# Altium footprint library SpaceVNXBaseBoard.PcbLib: 47 footprints (part 2 of 3)
Each footprint in its own frame and in the unit in brackets; x right, y up, seen from the top. Pads: shape width x height; smd on the part's side, far side on the other; paste and mask are expansions set on the pad; w line width, h text height; cw(c..) or ccw(c..) is an arc to the next point about the centre after c.
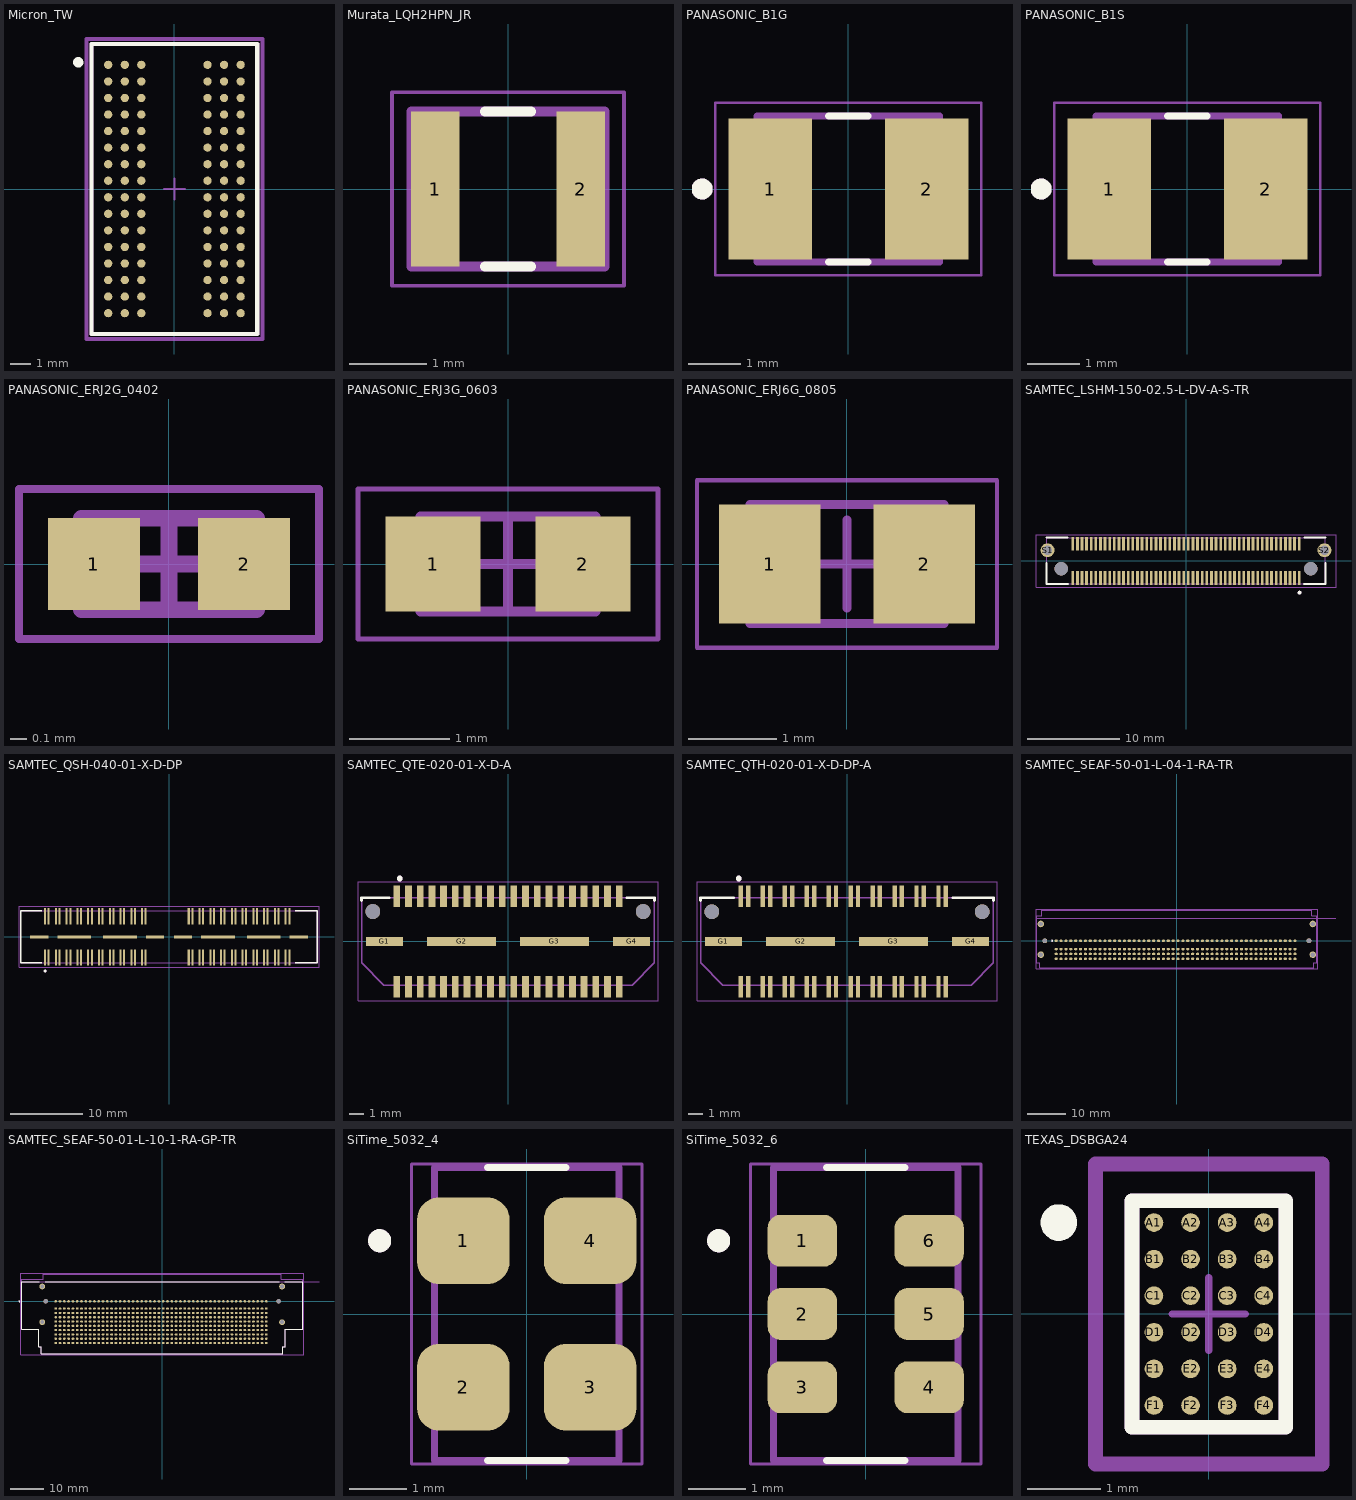
[diagram p1: the footprints below, top view; thin cyan lines are the x and y axes]

## Micron_TW [mm] "96-Ball FBGA 8mm x 14 mm"
pads (96):
  round 0.399 smd paste+0 mask+0: A1(-3.2,6) A2(-2.4,6) A3(-1.6,6) A7(1.6,6) A8(2.4,6) A9(3.2,6) B1(-3.2,5.2) B2(-2.4,5.2) B3(-1.6,5.2) B7(1.6,5.2) B8(2.4,5.2) B9(3.2,5.2) C1(-3.2,4.4) C2(-2.4,4.4) C3(-1.6,4.4) C7(1.6,4.4) C8(2.4,4.4) C9(3.2,4.4) D1(-3.2,3.6) D2(-2.4,3.6) D3(-1.6,3.6) D7(1.6,3.6) D8(2.4,3.6) D9(3.2,3.6) E1(-3.2,2.8) E2(-2.4,2.8) E3(-1.6,2.8) E7(1.6,2.8) E8(2.4,2.8) E9(3.2,2.8) F1(-3.2,2) F2(-2.4,2) F3(-1.6,2) F7(1.6,2) F8(2.4,2) F9(3.2,2) G1(-3.2,1.2) G2(-2.4,1.2) G3(-1.6,1.2) G7(1.6,1.2) G8(2.4,1.2) G9(3.2,1.2) H1(-3.2,0.4) H2(-2.4,0.4) H3(-1.6,0.4) H7(1.6,0.4) H8(2.4,0.4) H9(3.2,0.4) J1(-3.2,-0.4) J2(-2.4,-0.4) J3(-1.6,-0.4) J7(1.6,-0.4) J8(2.4,-0.4) J9(3.2,-0.4) K1(-3.2,-1.2) K2(-2.4,-1.2) K3(-1.6,-1.2) K7(1.6,-1.2) K8(2.4,-1.2) K9(3.2,-1.2) L1(-3.2,-2) L2(-2.4,-2) L3(-1.6,-2) L7(1.6,-2) L8(2.4,-2) L9(3.2,-2) M1(-3.2,-2.8) M2(-2.4,-2.8) M3(-1.6,-2.8) M7(1.6,-2.8) M8(2.4,-2.8) M9(3.2,-2.8) N1(-3.2,-3.6) N2(-2.4,-3.6) N3(-1.6,-3.6) N7(1.6,-3.6) N8(2.4,-3.6) N9(3.2,-3.6) P1(-3.2,-4.4) P2(-2.4,-4.4) P3(-1.6,-4.4) P7(1.6,-4.4) P8(2.4,-4.4) P9(3.2,-4.4) R1(-3.2,-5.2) R2(-2.4,-5.2) R3(-1.6,-5.2) R7(1.6,-5.2) R8(2.4,-5.2) R9(3.2,-5.2) T1(-3.2,-6) T2(-2.4,-6) T3(-1.6,-6) T7(1.6,-6) T8(2.4,-6) T9(3.2,-6)
Top Overlay:
  circle w0.25: c-4.65,6.125 r0.125
  lines w0.2: -4,-7 -4,7 4,7 4,-7 -4,-7
Mechanical 10:
  lines w0.2: -4.25,-7.25 -4.25,7.25 4.25,7.25 4.25,-7.25 -4.25,-7.25
  text ".Designator" at -4.318,-7.112 h1
Mechanical 12:
  lines w0.2: -4,-7 -4,7 4,7 4,-7 -4,-7
Mechanical 15:
  lines w0.1: -0.5,0 0.5,0 ; 0,-0.5 0,0.5
  lines w0.2: -4.25,-7.25 -4.25,7.25 4.25,7.25 4.25,-7.25 -4.25,-7.25
3D body "MICRON_TW.stp": height 1.21, standoff -0.09, extent -4,-7 4,7

## Murata_LQH2HPN_JR [mm] "1008 (2520)"
pads (2):
  rect 0.625x2 smd: 1(-0.937,0) 2(0.937,0)
Top Overlay:
  lines w0.127: -0.3,-1 0.3,-1 ; -0.3,1 0.3,1
Mechanical 13:
  lines w0.127: -1.25,-1 -1.25,1 1.25,1 1.25,-1 -1.25,-1
Mechanical 15:
  lines w0.05: -1.5,-1.25 -1.5,1.25 1.5,1.25 1.5,-1.25 -1.5,-1.25
3D body "LQH2HP_J0.stp": height 1.1, standoff 0, extent -1.25,-1 1.25,1

## PANASONIC_B1G [mm]
pads (2):
  rect 1.6x2.7 smd: 1(-1.5,0) 2(1.5,0)
Top Overlay:
  circle w0.2: c-2.8,0 r0.1
  lines w0.127: -0.38,-1.4 0.38,-1.4 ; -0.38,1.4 0.38,1.4
Mechanical 13:
  circle w0.2: c-2.8,0 r0.1
  lines w0.127: -1.75,-1.4 -1.75,1.4 1.75,1.4 1.75,-1.4 -1.75,-1.4
Mechanical 15:
  lines w0.05: -2.55,-1.65 -2.55,1.65 2.55,1.65 2.55,-1.65 -2.55,-1.65
3D body "B1G.stp": height 1.05, standoff -0.05, extent -1.778,-1.4 1.722,1.4

## PANASONIC_B1S [mm]
pads (2):
  rect 1.6x2.7 smd: 1(-1.5,0) 2(1.5,0)
Top Overlay:
  circle w0.2: c-2.8,0 r0.1
  lines w0.127: -0.38,-1.4 0.38,-1.4 ; -0.38,1.4 0.38,1.4
Mechanical 13:
  circle w0.2: c-2.8,0 r0.1
  lines w0.127: -1.75,-1.4 1.75,-1.4 1.75,1.4 -1.75,1.4 -1.75,-1.4
Mechanical 15:
  lines w0.05: -2.55,-1.65 2.55,-1.65 2.55,1.65 -2.55,1.65 -2.55,-1.65
3D body "B1S.stp": height 1.05, standoff -0.05, extent -1.75,-1.4 1.75,1.4

## PANASONIC_ERJ2G_0402 [mm] "Chip Resistor, 2-Leads, Body 1,00x0,50mm, IPC Medium Density"
height 0.4
pads (2):
  rect 0.55x0.55 smd: 1(-0.45,0) 2(0.45,0)
Mechanical 13:
  lines w0.1: -0.525,-0.275 -0.525,0.275 0.525,0.275 0.525,-0.275 -0.525,-0.275
Mechanical 15:
  lines w0.05: -0.9,-0.45 -0.9,0.45 0.9,0.45 0.9,-0.45 -0.9,-0.45
  lines w0.1: -0.275,0 0.275,0 ; 0,-0.275 0,0.275
3D body "ERJ2G_0402.STEP": height 0.36, standoff 0, extent -0.5,-0.25 0.5,0.25

## PANASONIC_ERJ3G_0603 [mm] "Chip Resistor, 2-Leads, Body 1,60x0,85mm, IPC Medium Density"
height 0.55
pads (2):
  rect 0.95x0.95 smd: 1(-0.75,0) 2(0.75,0)
Mechanical 13:
  lines w0.1: -0.875,-0.475 0.875,-0.475 0.875,0.475 -0.875,0.475 -0.875,-0.475
Mechanical 15:
  lines w0.05: -1.5,-0.75 1.5,-0.75 1.5,0.75 -1.5,0.75 -1.5,-0.75
  lines w0.1: -0.475,0 0.475,0 ; 0,-0.475 0,0.475
3D body "ERJ3G_0603.STEP": height 0.46, standoff 0, extent -0.775,-0.425 0.775,0.425

## PANASONIC_ERJ6G_0805 [mm] "Chip Resistor, 2-Leads, Body 2,00x1,25mm, IPC Medium Density"
height 0.7
pads (2):
  rect 1.15x1.35 smd: 1(-0.875,0) 2(0.875,0)
Mechanical 13:
  lines w0.1: -1.1,-0.675 -1.1,0.675 1.1,0.675 1.1,-0.675 -1.1,-0.675
Mechanical 15:
  lines w0.05: -1.7,-0.95 -1.7,0.95 1.7,0.95 1.7,-0.95 -1.7,-0.95
  lines w0.1: -0.5,0 0.5,0 ; 0,-0.5 0,0.5
3D body "ERJ6G_0805.STEP": height 0.45, standoff 0, extent -1,-0.625 1,0.625

## SAMTEC_LSHM-150-02.5-L-DV-A-S-TR [mm]
pads (104):
  rect 0.3x1.5 smd: 1(12.25,-1.85) 2(12.25,1.85) 3(11.75,-1.85) 4(11.75,1.85) 5(11.25,-1.85) 6(11.25,1.85) 7(10.75,-1.85) 8(10.75,1.85) 9(10.25,-1.85) 10(10.25,1.85) 11(9.75,-1.85) 12(9.75,1.85) 13(9.25,-1.85) 14(9.25,1.85) 15(8.75,-1.85) 16(8.75,1.85) 17(8.25,-1.85) 18(8.25,1.85) 19(7.75,-1.85) 20(7.75,1.85) 21(7.25,-1.85) 22(7.25,1.85) 23(6.75,-1.85) 24(6.75,1.85) 25(6.25,-1.85) 26(6.25,1.85) 27(5.75,-1.85) 28(5.75,1.85) 29(5.25,-1.85) 30(5.25,1.85) 31(4.75,-1.85) 32(4.75,1.85) 33(4.25,-1.85) 34(4.25,1.85) 35(3.75,-1.85) 36(3.75,1.85) 37(3.25,-1.85) 38(3.25,1.85) 39(2.75,-1.85) 40(2.75,1.85) 41(2.25,-1.85) 42(2.25,1.85) 43(1.75,-1.85) 44(1.75,1.85) 45(1.25,-1.85) 46(1.25,1.85) 47(0.75,-1.85) 48(0.75,1.85) 49(0.25,-1.85) 50(0.25,1.85) 51(-0.25,-1.85) 52(-0.25,1.85) 53(-0.75,-1.85) 54(-0.75,1.85) 55(-1.25,-1.85) 56(-1.25,1.85) 57(-1.75,-1.85) 58(-1.75,1.85) 59(-2.25,-1.85) 60(-2.25,1.85) 61(-2.75,-1.85) 62(-2.75,1.85) 63(-3.25,-1.85) 64(-3.25,1.85) 65(-3.75,-1.85) 66(-3.75,1.85) 67(-4.25,-1.85) 68(-4.25,1.85) 69(-4.75,-1.85) 70(-4.75,1.85) 71(-5.25,-1.85) 72(-5.25,1.85) 73(-5.75,-1.85) 74(-5.75,1.85) 75(-6.25,-1.85) 76(-6.25,1.85) 77(-6.75,-1.85) 78(-6.75,1.85) 79(-7.25,-1.85) 80(-7.25,1.85) 81(-7.75,-1.85) 82(-7.75,1.85) 83(-8.25,-1.85) 84(-8.25,1.85) 85(-8.75,-1.85) 86(-8.75,1.85) 87(-9.25,-1.85) 88(-9.25,1.85) 89(-9.75,-1.85) 90(-9.75,1.85) 91(-10.25,-1.85) 92(-10.25,1.85) 93(-10.75,-1.85) 94(-10.75,1.85) 95(-11.25,-1.85) 96(-11.25,1.85) 97(-11.75,-1.85) 98(-11.75,1.85) 99(-12.25,-1.85) 100(-12.25,1.85)
  round 1.5 hole 1: S1(-14.975,1.15) S2(14.975,1.15)
  round 1.45 hole 1.45 unplated: ""(-13.5,-0.85) ""(13.5,-0.85)
Top Overlay:
  circle w0.2: c12.279,-3.429 r0.1
  lines w0.2: -15.075,-0.3 -15.075,-2.49 ; -15.075,-0.2 -15.075,-2.49 ; -15.075,2.51 -12.8,2.51 ; -12.8,-2.49 -15.075,-2.49 ; -12.75,-2.49 -15.075,-2.49 ; 12.75,-2.49 15.075,-2.49 ; 12.8,2.51 15.075,2.51 ; 15.075,-0.3 15.075,-2.49 ; 15.075,-0.2 15.075,-2.49
Top Paste:
  circle w1: c14.975,1.15 r0.5
  circle w1: c-14.975,1.15 r0.5
Mechanical 13:
  circle w0.2: c12.279,-3.429 r0.1
  lines w0.1: -15.075,-2.49 15.075,-2.49 15.075,2.49 -15.075,2.49 -15.075,-2.49
Mechanical 15:
  lines w0.05: -16.225,-2.85 16.225,-2.85 16.225,2.85 -16.225,2.85 -16.225,-2.85
3D body "LSHM-150-02.5-L-DV-A-S-TR.stp": height 3.8, standoff -1.8, extent -15.401,-2.49 15.401,2.54

## SAMTEC_QSH-040-01-X-D-DP [mm]
pads (88):
  rect 0.28x2.27 smd: 01(-17.25,-2.87) 02(-17.25,2.87) 03(-16.75,-2.87) 04(-16.75,2.87) 05(-15.75,-2.87) 06(-15.75,2.87) 07(-15.25,-2.87) 08(-15.25,2.87) 09(-14.25,-2.87) 10(-14.25,2.87) 11(-13.75,-2.87) 12(-13.75,2.87) 13(-12.75,-2.87) 14(-12.75,2.87) 15(-12.25,-2.87) 16(-12.25,2.87) 17(-11.25,-2.87) 18(-11.25,2.87) 19(-10.75,-2.87) 20(-10.75,2.87) 21(-9.75,-2.87) 22(-9.75,2.87) 23(-9.25,-2.87) 24(-9.25,2.87) 25(-8.25,-2.87) 26(-8.25,2.87) 27(-7.75,-2.87) 28(-7.75,2.87) 29(-6.75,-2.87) 30(-6.75,2.87) 31(-6.25,-2.87) 32(-6.25,2.87) 33(-5.25,-2.87) 34(-5.25,2.87) 35(-4.75,-2.87) 36(-4.75,2.87) 37(-3.75,-2.87) 38(-3.75,2.87) 39(-3.25,-2.87) 40(-3.25,2.87) 41(2.75,-2.87) 42(2.75,2.87) 43(3.25,-2.87) 44(3.25,2.87) 45(4.25,-2.87) 46(4.25,2.87) 47(4.75,-2.87) 48(4.75,2.87) 49(5.75,-2.87) 50(5.75,2.87) 51(6.25,-2.87) 52(6.25,2.87) 53(7.25,-2.87) 54(7.25,2.87) 55(7.75,-2.87) 56(7.75,2.87) 57(8.75,-2.87) 58(8.75,2.87) 59(9.25,-2.87) 60(9.25,2.87) 61(10.25,-2.87) 62(10.25,2.87) 63(10.75,-2.87) 64(10.75,2.87) 65(11.75,-2.87) 66(11.75,2.87) 67(12.25,-2.87) 68(12.25,2.87) 69(13.25,-2.87) 70(13.25,2.87) 71(13.75,-2.87) 72(13.75,2.87) 73(14.75,-2.87) 74(14.75,2.87) 75(15.25,-2.87) 76(15.25,2.87) 77(16.25,-2.87) 78(16.25,2.87) 79(16.75,-2.87) 80(16.75,2.87)
  rect 2.54x0.43 smd: GND1(-18.07,0) GND4(-1.94,0) GND5(1.94,0) GND8(18.07,0)
  rect 4.7x0.43 smd: GND2(-13.18,0) GND3(-6.83,0) GND6(6.83,0) GND7(13.18,0)
Top Overlay:
  circle w0.2: c-17.25,-4.75 r0.1
  lines w0.2: -17.75,-3.62 -20.638,-3.62 -20.638,3.62 -17.75,3.62 ; 17.55,-3.62 20.638,-3.62 20.638,3.62 17.55,3.62
Mechanical 13:
  circle w0.2: c-17.25,-4.75 r0.1
  lines w0.1: -20.638,-3.62 20.638,-3.62 20.638,3.62 -20.638,3.62 -20.638,-3.62
Mechanical 15:
  lines w0.05: -20.888,-4.255 -20.888,4.255 20.888,4.255 20.888,-4.255 -20.888,-4.255
3D body "QSH-040-01-F-D-DP.stp": height 3.05, standoff -0.2, extent -20.656,-3.747 20.657,3.747

## SAMTEC_QTE-020-01-X-D-A [mm]
pads (46):
  rect 0.46x1.45 smd: 01(-7.6,3.09) 02(-7.6,-3.09) 03(-6.8,3.09) 04(-6.8,-3.09) 05(-6,3.09) 06(-6,-3.09) 07(-5.2,3.09) 08(-5.2,-3.09) 09(-4.4,3.09) 10(-4.4,-3.09) 11(-3.6,3.09) 12(-3.6,-3.09) 13(-2.8,3.09) 14(-2.8,-3.09) 15(-2,3.09) 16(-2,-3.09) 17(-1.2,3.09) 18(-1.2,-3.09) 19(-0.4,3.09) 20(-0.4,-3.09) 21(0.4,3.09) 22(0.4,-3.09) 23(1.2,3.09) 24(1.2,-3.09) 25(2,3.09) 26(2,-3.09) 27(2.8,3.09) 28(2.8,-3.09) 29(3.6,3.09) 30(3.6,-3.09) 31(4.4,3.09) 32(4.4,-3.09) 33(5.2,3.09) 34(5.2,-3.09) 35(6,3.09) 36(6,-3.09) 37(6.8,3.09) 38(6.8,-3.09) 39(7.6,3.09) 40(7.6,-3.09)
  rect 2.54x0.64 smd: G1(-8.445,0) G4(8.445,0)
  rect 4.7x0.64 smd: G2(-3.175,0) G3(3.175,0)
  round 1.02 hole 1.02 unplated: ""(-9.24,2.04) ""(9.24,2.04)
Top Overlay:
  circle w0.2: c-7.4,4.3 r0.1
  lines w0.2: -10,2.79 -10,2.985 -8.128,2.985 ; 8.128,2.985 10,2.985 10,2.79
Mechanical 13:
  circle w0.2: c-7.4,4.3 r0.1
  lines w0.1: -10,-1.465 -10,2.985 10,2.985 10,-1.465 8.48,-2.985 -8.48,-2.985 -10,-1.465
Mechanical 15:
  lines w0.05: -10.25,-4.065 -10.25,4.065 10.25,4.065 10.25,-4.065 -10.25,-4.065
3D body "QTE-020-01-C-D-A.stp": height 4.06, standoff -0.91, extent -10.008,-3.556 10.008,3.556

## SAMTEC_QTH-020-01-X-D-DP-A [mm]
pads (46):
  rect 0.3x1.45 smd: 01(-7.25,3.09) 02(-7.25,-3.09) 03(-6.75,3.09) 04(-6.75,-3.09) 05(-5.75,3.09) 06(-5.75,-3.09) 07(-5.25,3.09) 08(-5.25,-3.09) 09(-4.25,3.09) 10(-4.25,-3.09) 11(-3.75,3.09) 12(-3.75,-3.09) 13(-2.75,3.09) 14(-2.75,-3.09) 15(-2.25,3.09) 16(-2.25,-3.09) 17(-1.25,3.09) 18(-1.25,-3.09) 19(-0.75,3.09) 20(-0.75,-3.09) 21(0.25,3.09) 22(0.25,-3.09) 23(0.75,3.09) 24(0.75,-3.09) 25(1.75,3.09) 26(1.75,-3.09) 27(2.25,3.09) 28(2.25,-3.09) 29(3.25,3.09) 30(3.25,-3.09) 31(3.75,3.09) 32(3.75,-3.09) 33(4.75,3.09) 34(4.75,-3.09) 35(5.25,3.09) 36(5.25,-3.09) 37(6.25,3.09) 38(6.25,-3.09) 39(6.75,3.09) 40(6.75,-3.09)
  rect 2.54x0.64 smd: G1(-8.445,0) G4(8.445,0)
  rect 4.7x0.64 smd: G2(-3.175,0) G3(3.175,0)
  round 1.02 hole 1.02 unplated: ""(-9.24,2.03) ""(9.24,2.03)
Top Overlay:
  circle w0.2: c-7.4,4.3 r0.1
  lines w0.2: -10,2.79 -10,2.985 -7.75,2.985 ; 7.25,2.985 10,2.985 10,2.79
Mechanical 13:
  circle w0.2: c-7.4,4.3 r0.1
  lines w0.1: -10,-1.465 -8.48,-2.985 8.48,-2.985 10,-1.465 10,2.985 -10,2.985 -10,-1.465
Mechanical 15:
  lines w0.05: -10.25,-4.065 10.25,-4.065 10.25,4.065 -10.25,4.065 -10.25,-4.065
3D body "QTH-020-01-F-D-DP-A.stp": height 4.06, standoff -0.97, extent -10.007,-3.556 10.008,3.556

## SAMTEC_SEAF-50-01-L-04-1-RA-TR [mm]
pads (206):
  oval 0.84x0.64 smd paste-1: A1(-31.445,0) A2(-30.175,0) A3(-28.905,0) A4(-27.635,0) A5(-26.365,0) A6(-25.095,0) A7(-23.825,0) A8(-22.555,0) A9(-21.285,0) A10(-20.015,0) A11(-18.745,0) A12(-17.475,0) A13(-16.205,0) A14(-14.935,0) A15(-13.665,0) A16(-12.395,0) A17(-11.125,0) A18(-9.855,0) A19(-8.585,0) A20(-7.315,0) A21(-6.045,0) A22(-4.775,0) A23(-3.505,0) A24(-2.235,0) A25(-0.965,0) A26(0.305,0) A27(1.575,0) A28(2.845,0) A29(4.115,0) A30(5.385,0) A31(6.655,0) A32(7.925,0) A33(9.195,0) A34(10.465,0) A35(11.735,0) A36(13.005,0) A37(14.275,0) A38(15.545,0) A39(16.815,0) A40(18.085,0) A41(19.355,0) A42(20.625,0) A43(21.895,0) A44(23.165,0) A45(24.435,0) A46(25.705,0) A47(26.975,0) A48(28.245,0) A49(29.515,0) A50(30.785,0) B1(-31.445,-2.16) B2(-30.175,-2.16) B3(-28.905,-2.16) B4(-27.635,-2.16) B5(-26.365,-2.16) B6(-25.095,-2.16) B7(-23.825,-2.16) B8(-22.555,-2.16) B9(-21.285,-2.16) B10(-20.015,-2.16) B11(-18.745,-2.16) B12(-17.475,-2.16) B13(-16.205,-2.16) B14(-14.935,-2.16) B15(-13.665,-2.16) B16(-12.395,-2.16) B17(-11.125,-2.16) B18(-9.855,-2.16) B19(-8.585,-2.16) B20(-7.315,-2.16) B21(-6.045,-2.16) B22(-4.775,-2.16) B23(-3.505,-2.16) B24(-2.235,-2.16) B25(-0.965,-2.16) B26(0.305,-2.16) B27(1.575,-2.16) B28(2.845,-2.16) B29(4.115,-2.16) B30(5.385,-2.16) B31(6.655,-2.16) B32(7.925,-2.16) B33(9.195,-2.16) B34(10.465,-2.16) B35(11.735,-2.16) B36(13.005,-2.16) B37(14.275,-2.16) B38(15.545,-2.16) B39(16.815,-2.16) B40(18.085,-2.16) B41(19.355,-2.16) B42(20.625,-2.16) B43(21.895,-2.16) B44(23.165,-2.16) B45(24.435,-2.16) B46(25.705,-2.16) B47(26.975,-2.16) B48(28.245,-2.16) B49(29.515,-2.16) B50(30.785,-2.16) C1(-31.445,-3.43) C2(-30.175,-3.43) C3(-28.905,-3.43) C4(-27.635,-3.43) C5(-26.365,-3.43) C6(-25.095,-3.43) C7(-23.825,-3.43) C8(-22.555,-3.43) C9(-21.285,-3.43) C10(-20.015,-3.43) C11(-18.745,-3.43) C12(-17.475,-3.43) C13(-16.205,-3.43) C14(-14.935,-3.43) C15(-13.665,-3.43) C16(-12.395,-3.43) C17(-11.125,-3.43) C18(-9.855,-3.43) C19(-8.585,-3.43) C20(-7.315,-3.43) C21(-6.045,-3.43) C22(-4.775,-3.43) C23(-3.505,-3.43) C24(-2.235,-3.43) C25(-0.965,-3.43) C26(0.305,-3.43) C27(1.575,-3.43) C28(2.845,-3.43) C29(4.115,-3.43) C30(5.385,-3.43) C31(6.655,-3.43) C32(7.925,-3.43) C33(9.195,-3.43) C34(10.465,-3.43) C35(11.735,-3.43) C36(13.005,-3.43) C37(14.275,-3.43) C38(15.545,-3.43) C39(16.815,-3.43) C40(18.085,-3.43) C41(19.355,-3.43) C42(20.625,-3.43) C43(21.895,-3.43) C44(23.165,-3.43) C45(24.435,-3.43) C46(25.705,-3.43) C47(26.975,-3.43) C48(28.245,-3.43) C49(29.515,-3.43) C50(30.785,-3.43) D1(-31.445,-4.7) D2(-30.175,-4.7) D3(-28.905,-4.7) D4(-27.635,-4.7) D5(-26.365,-4.7) D6(-25.095,-4.7) D7(-23.825,-4.7) D8(-22.555,-4.7) D9(-21.285,-4.7) D10(-20.015,-4.7) D11(-18.745,-4.7) D12(-17.475,-4.7) D13(-16.205,-4.7) D14(-14.935,-4.7) D15(-13.665,-4.7) D16(-12.395,-4.7) D17(-11.125,-4.7) D18(-9.855,-4.7) D19(-8.585,-4.7) D20(-7.315,-4.7) D21(-6.045,-4.7) D22(-4.775,-4.7) D23(-3.505,-4.7) D24(-2.235,-4.7) D25(-0.965,-4.7) D26(0.305,-4.7) D27(1.575,-4.7) D28(2.845,-4.7) D29(4.115,-4.7) D30(5.385,-4.7) D31(6.655,-4.7) D32(7.925,-4.7) D33(9.195,-4.7) D34(10.465,-4.7) D35(11.735,-4.7) D36(13.005,-4.7) D37(14.275,-4.7) D38(15.545,-4.7) D39(16.815,-4.7) D40(18.085,-4.7) D41(19.355,-4.7) D42(20.625,-4.7) D43(21.895,-4.7) D44(23.165,-4.7) D45(24.435,-4.7) D46(25.705,-4.7) D47(26.975,-4.7) D48(28.245,-4.7) D49(29.515,-4.7) D50(30.785,-4.7)
  round 1.71 hole 1.14: S1(-35.435,4.38) S2(35.435,4.38) S3(-35.435,-3.62) S4(35.435,-3.62)
  round 1.27 hole 1.27 unplated: ""(-34.415,0) ""(34.415,0)
Top Overlay:
  circle w0.2: c-32.5,0 r0.1
Top Paste:
  drawing of 204 lines, arcs and shapes, not listed
Mechanical 13:
  circle w0.2: c-32.5,0 r0.1
  lines w0.1: 41.47,5.84 -36.45,5.84 ; -36.45,5.84 -36.45,-5.78 -35.685,-5.78 -35.685,-7.05 35.685,-7.05 35.685,-5.78 36.45,-5.78 36.45,6.49 35.18,6.49 35.18,7.99 -35.18,7.99 -35.18,6.49 -36.45,6.49 -36.45,5.84
  text "PCB EDGE" at 36.92,6 h0.61
Mechanical 15:
  lines w0.05: -36.7,-7.3 -36.7,8.24 36.7,8.24 36.7,-7.3 -36.7,-7.3
3D body "SEAF-50-01-L-04-1-RA-TR.stp": height 7.82, standoff -1.6, extent -36.449,-7.036 36.449,7.988

## SAMTEC_SEAF-50-01-L-10-1-RA-GP-TR [mm] "High-Speed Right-Angled Open-Pin-Field Array Socket"
pads (506):
  oval 0.84x0.64 smd paste-1: A1(-31.445,0) A2(-30.175,0) A3(-28.905,0) A4(-27.635,0) A5(-26.365,0) A6(-25.095,0) A7(-23.825,0) A8(-22.555,0) A9(-21.285,0) A10(-20.015,0) A11(-18.745,0) A12(-17.475,0) A13(-16.205,0) A14(-14.935,0) A15(-13.665,0) A16(-12.395,0) A17(-11.125,0) A18(-9.855,0) A19(-8.585,0) A20(-7.315,0) A21(-6.045,0) A22(-4.775,0) A23(-3.505,0) A24(-2.235,0) A25(-0.965,0) A26(0.305,0) A27(1.575,0) A28(2.845,0) A29(4.115,0) A30(5.385,0) A31(6.655,0) A32(7.925,0) A33(9.195,0) A34(10.465,0) A35(11.735,0) A36(13.005,0) A37(14.275,0) A38(15.545,0) A39(16.815,0) A40(18.085,0) A41(19.355,0) A42(20.625,0) A43(21.895,0) A44(23.165,0) A45(24.435,0) A46(25.705,0) A47(26.975,0) A48(28.245,0) A49(29.515,0) A50(30.785,0) B1(-31.445,-2.16) B2(-30.175,-2.16) B3(-28.905,-2.16) B4(-27.635,-2.16) B5(-26.365,-2.16) B6(-25.095,-2.16) B7(-23.825,-2.16) B8(-22.555,-2.16) B9(-21.285,-2.16) B10(-20.015,-2.16) B11(-18.745,-2.16) B12(-17.475,-2.16) B13(-16.205,-2.16) B14(-14.935,-2.16) B15(-13.665,-2.16) B16(-12.395,-2.16) B17(-11.125,-2.16) B18(-9.855,-2.16) B19(-8.585,-2.16) B20(-7.315,-2.16) B21(-6.045,-2.16) B22(-4.775,-2.16) B23(-3.505,-2.16) B24(-2.235,-2.16) B25(-0.965,-2.16) B26(0.305,-2.16) B27(1.575,-2.16) B28(2.845,-2.16) B29(4.115,-2.16) B30(5.385,-2.16) B31(6.655,-2.16) B32(7.925,-2.16) B33(9.195,-2.16) B34(10.465,-2.16) B35(11.735,-2.16) B36(13.005,-2.16) B37(14.275,-2.16) B38(15.545,-2.16) B39(16.815,-2.16) B40(18.085,-2.16) B41(19.355,-2.16) B42(20.625,-2.16) B43(21.895,-2.16) B44(23.165,-2.16) B45(24.435,-2.16) B46(25.705,-2.16) B47(26.975,-2.16) B48(28.245,-2.16) B49(29.515,-2.16) B50(30.785,-2.16) C1(-31.445,-3.43) C2(-30.175,-3.43) C3(-28.905,-3.43) C4(-27.635,-3.43) C5(-26.365,-3.43) C6(-25.095,-3.43) C7(-23.825,-3.43) C8(-22.555,-3.43) C9(-21.285,-3.43) C10(-20.015,-3.43) C11(-18.745,-3.43) C12(-17.475,-3.43) C13(-16.205,-3.43) C14(-14.935,-3.43) C15(-13.665,-3.43) C16(-12.395,-3.43) C17(-11.125,-3.43) C18(-9.855,-3.43) C19(-8.585,-3.43) C20(-7.315,-3.43) C21(-6.045,-3.43) C22(-4.775,-3.43) C23(-3.505,-3.43) C24(-2.235,-3.43) C25(-0.965,-3.43) C26(0.305,-3.43) C27(1.575,-3.43) C28(2.845,-3.43) C29(4.115,-3.43) C30(5.385,-3.43) C31(6.655,-3.43) C32(7.925,-3.43) C33(9.195,-3.43) C34(10.465,-3.43) C35(11.735,-3.43) C36(13.005,-3.43) C37(14.275,-3.43) C38(15.545,-3.43) C39(16.815,-3.43) C40(18.085,-3.43) C41(19.355,-3.43) C42(20.625,-3.43) C43(21.895,-3.43) C44(23.165,-3.43) C45(24.435,-3.43) C46(25.705,-3.43) C47(26.975,-3.43) C48(28.245,-3.43) C49(29.515,-3.43) C50(30.785,-3.43) D1(-31.445,-4.7) D2(-30.175,-4.7) D3(-28.905,-4.7) D4(-27.635,-4.7) D5(-26.365,-4.7) D6(-25.095,-4.7) D7(-23.825,-4.7) D8(-22.555,-4.7) D9(-21.285,-4.7) D10(-20.015,-4.7) D11(-18.745,-4.7) D12(-17.475,-4.7) D13(-16.205,-4.7) D14(-14.935,-4.7) D15(-13.665,-4.7) D16(-12.395,-4.7) D17(-11.125,-4.7) D18(-9.855,-4.7) D19(-8.585,-4.7) D20(-7.315,-4.7) D21(-6.045,-4.7) D22(-4.775,-4.7) D23(-3.505,-4.7) D24(-2.235,-4.7) D25(-0.965,-4.7) D26(0.305,-4.7) D27(1.575,-4.7) D28(2.845,-4.7) D29(4.115,-4.7) D30(5.385,-4.7) D31(6.655,-4.7) D32(7.925,-4.7) D33(9.195,-4.7) D34(10.465,-4.7) D35(11.735,-4.7) D36(13.005,-4.7) D37(14.275,-4.7) D38(15.545,-4.7) D39(16.815,-4.7) D40(18.085,-4.7) D41(19.355,-4.7) D42(20.625,-4.7) D43(21.895,-4.7) D44(23.165,-4.7) D45(24.435,-4.7) D46(25.705,-4.7) D47(26.975,-4.7) D48(28.245,-4.7) D49(29.515,-4.7) D50(30.785,-4.7) E1(-31.445,-5.97) E2(-30.175,-5.97) E3(-28.905,-5.97) E4(-27.635,-5.97) E5(-26.365,-5.97) E6(-25.095,-5.97) E7(-23.825,-5.97) E8(-22.555,-5.97) E9(-21.285,-5.97) E10(-20.015,-5.97) E11(-18.745,-5.97) E12(-17.475,-5.97) E13(-16.205,-5.97) E14(-14.935,-5.97) E15(-13.665,-5.97) E16(-12.395,-5.97) E17(-11.125,-5.97) E18(-9.855,-5.97) E19(-8.585,-5.97) E20(-7.315,-5.97) E21(-6.045,-5.97) E22(-4.775,-5.97) E23(-3.505,-5.97) E24(-2.235,-5.97) E25(-0.965,-5.97) E26(0.305,-5.97) E27(1.575,-5.97) E28(2.845,-5.97) E29(4.115,-5.97) E30(5.385,-5.97) E31(6.655,-5.97) E32(7.925,-5.97) E33(9.195,-5.97) E34(10.465,-5.97) E35(11.735,-5.97) E36(13.005,-5.97) E37(14.275,-5.97) E38(15.545,-5.97) E39(16.815,-5.97) E40(18.085,-5.97) E41(19.355,-5.97) E42(20.625,-5.97) E43(21.895,-5.97) E44(23.165,-5.97) E45(24.435,-5.97) E46(25.705,-5.97) E47(26.975,-5.97) E48(28.245,-5.97) E49(29.515,-5.97) E50(30.785,-5.97) F1(-31.445,-7.24) F2(-30.175,-7.24) F3(-28.905,-7.24) F4(-27.635,-7.24) F5(-26.365,-7.24) F6(-25.095,-7.24) F7(-23.825,-7.24) F8(-22.555,-7.24) F9(-21.285,-7.24) F10(-20.015,-7.24) F11(-18.745,-7.24) F12(-17.475,-7.24) F13(-16.205,-7.24) F14(-14.935,-7.24) F15(-13.665,-7.24) F16(-12.395,-7.24) F17(-11.125,-7.24) F18(-9.855,-7.24) F19(-8.585,-7.24) F20(-7.315,-7.24) F21(-6.045,-7.24) F22(-4.775,-7.24) F23(-3.505,-7.24) F24(-2.235,-7.24) F25(-0.965,-7.24) F26(0.305,-7.24) F27(1.575,-7.24) F28(2.845,-7.24) F29(4.115,-7.24) F30(5.385,-7.24) F31(6.655,-7.24) F32(7.925,-7.24) F33(9.195,-7.24) F34(10.465,-7.24) F35(11.735,-7.24) F36(13.005,-7.24) F37(14.275,-7.24) F38(15.545,-7.24) F39(16.815,-7.24) F40(18.085,-7.24) F41(19.355,-7.24) F42(20.625,-7.24) F43(21.895,-7.24) F44(23.165,-7.24) F45(24.435,-7.24) F46(25.705,-7.24) F47(26.975,-7.24) F48(28.245,-7.24) F49(29.515,-7.24) F50(30.785,-7.24) G1(-31.445,-8.51) G2(-30.175,-8.51) G3(-28.905,-8.51) G4(-27.635,-8.51) G5(-26.365,-8.51) G6(-25.095,-8.51) G7(-23.825,-8.51) G8(-22.555,-8.51) G9(-21.285,-8.51) G10(-20.015,-8.51) G11(-18.745,-8.51) G12(-17.475,-8.51) G13(-16.205,-8.51) G14(-14.935,-8.51) G15(-13.665,-8.51) G16(-12.395,-8.51) G17(-11.125,-8.51) G18(-9.855,-8.51) G19(-8.585,-8.51) G20(-7.315,-8.51) G21(-6.045,-8.51) G22(-4.775,-8.51) G23(-3.505,-8.51) G24(-2.235,-8.51) G25(-0.965,-8.51) G26(0.305,-8.51) G27(1.575,-8.51) G28(2.845,-8.51) G29(4.115,-8.51) G30(5.385,-8.51) G31(6.655,-8.51) G32(7.925,-8.51) G33(9.195,-8.51) G34(10.465,-8.51) G35(11.735,-8.51) G36(13.005,-8.51) G37(14.275,-8.51) G38(15.545,-8.51) G39(16.815,-8.51) G40(18.085,-8.51) G41(19.355,-8.51) G42(20.625,-8.51) G43(21.895,-8.51) G44(23.165,-8.51) G45(24.435,-8.51) G46(25.705,-8.51) G47(26.975,-8.51) G48(28.245,-8.51) G49(29.515,-8.51) G50(30.785,-8.51) H1(-31.445,-9.78) H2(-30.175,-9.78) H3(-28.905,-9.78) H4(-27.635,-9.78) H5(-26.365,-9.78) H6(-25.095,-9.78) H7(-23.825,-9.78) H8(-22.555,-9.78) H9(-21.285,-9.78) H10(-20.015,-9.78) H11(-18.745,-9.78) H12(-17.475,-9.78) H13(-16.205,-9.78) H14(-14.935,-9.78) H15(-13.665,-9.78) H16(-12.395,-9.78) H17(-11.125,-9.78) H18(-9.855,-9.78) H19(-8.585,-9.78) H20(-7.315,-9.78) H21(-6.045,-9.78) H22(-4.775,-9.78) H23(-3.505,-9.78) H24(-2.235,-9.78) H25(-0.965,-9.78) H26(0.305,-9.78) H27(1.575,-9.78) H28(2.845,-9.78) H29(4.115,-9.78) H30(5.385,-9.78) H31(6.655,-9.78) H32(7.925,-9.78) H33(9.195,-9.78) H34(10.465,-9.78) H35(11.735,-9.78) H36(13.005,-9.78) H37(14.275,-9.78) H38(15.545,-9.78) H39(16.815,-9.78) H40(18.085,-9.78) H41(19.355,-9.78) H42(20.625,-9.78) H43(21.895,-9.78) H44(23.165,-9.78) H45(24.435,-9.78) H46(25.705,-9.78) H47(26.975,-9.78) H48(28.245,-9.78) H49(29.515,-9.78) H50(30.785,-9.78) I1(-31.445,-11.05) I2(-30.175,-11.05) I3(-28.905,-11.05) I4(-27.635,-11.05) I5(-26.365,-11.05) I6(-25.095,-11.05) I7(-23.825,-11.05) I8(-22.555,-11.05) I9(-21.285,-11.05) I10(-20.015,-11.05) I11(-18.745,-11.05) I12(-17.475,-11.05) I13(-16.205,-11.05) I14(-14.935,-11.05) I15(-13.665,-11.05) I16(-12.395,-11.05) I17(-11.125,-11.05) I18(-9.855,-11.05) I19(-8.585,-11.05) I20(-7.315,-11.05) I21(-6.045,-11.05) I22(-4.775,-11.05) I23(-3.505,-11.05) I24(-2.235,-11.05) I25(-0.965,-11.05) I26(0.305,-11.05) I27(1.575,-11.05) I28(2.845,-11.05) I29(4.115,-11.05) I30(5.385,-11.05) I31(6.655,-11.05) I32(7.925,-11.05) I33(9.195,-11.05) I34(10.465,-11.05) I35(11.735,-11.05) I36(13.005,-11.05) I37(14.275,-11.05) I38(15.545,-11.05) I39(16.815,-11.05) I40(18.085,-11.05) I41(19.355,-11.05) I42(20.625,-11.05) I43(21.895,-11.05) I44(23.165,-11.05) I45(24.435,-11.05) I46(25.705,-11.05) I47(26.975,-11.05) I48(28.245,-11.05) I49(29.515,-11.05) I50(30.785,-11.05) J1(-31.445,-12.32) J2(-30.175,-12.32) J3(-28.905,-12.32) J4(-27.635,-12.32) J5(-26.365,-12.32) J6(-25.095,-12.32) J7(-23.825,-12.32) J8(-22.555,-12.32) J9(-21.285,-12.32) J10(-20.015,-12.32) J11(-18.745,-12.32) J12(-17.475,-12.32) J13(-16.205,-12.32) J14(-14.935,-12.32) J15(-13.665,-12.32) J16(-12.395,-12.32) J17(-11.125,-12.32) J18(-9.855,-12.32) J19(-8.585,-12.32) J20(-7.315,-12.32) J21(-6.045,-12.32) J22(-4.775,-12.32) J23(-3.505,-12.32) J24(-2.235,-12.32) J25(-0.965,-12.32) J26(0.305,-12.32) J27(1.575,-12.32) J28(2.845,-12.32) J29(4.115,-12.32) J30(5.385,-12.32) J31(6.655,-12.32) J32(7.925,-12.32) J33(9.195,-12.32) J34(10.465,-12.32) J35(11.735,-12.32) J36(13.005,-12.32) J37(14.275,-12.32) J38(15.545,-12.32) J39(16.815,-12.32) J40(18.085,-12.32) J41(19.355,-12.32) J42(20.625,-12.32) J43(21.895,-12.32) J44(23.165,-12.32) J45(24.435,-12.32) J46(25.705,-12.32) J47(26.975,-12.32) J48(28.245,-12.32) J49(29.515,-12.32) J50(30.785,-12.32)
  round 1.71 hole 1.14: S1(-35.435,4.38) S2(35.435,4.38) S3(-35.435,-6.16) S4(35.435,-6.16)
  round 1.27 hole 1.27 unplated: ""(-34.415,0) ""(34.415,0)
Top Overlay:
  circle w0.2: c-42.2,0 r0.1
  lines w0.2: -36.3,5.84 -41.53,5.84 -41.53,-8.32 -36.45,-8.32 -36.45,-13.4 -35.685,-13.4 -35.685,-15.48 35.685,-15.48 35.685,-13.4 36.45,-13.4 36.45,-8.32 41.53,-8.32 41.53,5.84 36.3,5.84 ; -34.55,5.84 34.55,5.84
Top Paste:
  drawing of 504 lines, arcs and shapes, not listed
Mechanical 13:
  circle w0.2: c-42.2,0 r0.1
  lines w0.1: 46.35,5.84 41.53,5.84 ; -41.53,5.84 41.53,5.84 ; -41.53,5.84 -41.53,6.49 -35.18,6.49 -35.18,7.99 35.18,7.99 35.18,6.49 41.53,6.49 41.53,5.84 ; -41.53,5.84 -41.53,-8.32 -36.45,-8.32 -36.45,-13.4 -35.685,-13.4 -35.685,-15.48 35.685,-15.48 35.685,-13.4 36.45,-13.4 36.45,-8.32 41.53,-8.32 41.53,5.84
  text "PCB EDGE" at 42.35,6 h1.27
Mechanical 15:
  lines w0.05: -41.78,-15.73 41.78,-15.73 41.78,8.24 -41.78,8.24 -41.78,-15.73
3D body "SEAF-50-01-L-10-1-RA-GP-TR.stp": height 14.63, standoff -2.41, extent -41.529,-15.011 41.529,7.988

## SiTime_5032_4 [mm] "5.0 x 3.2 mm 4 Pin"
pads (4):
  rrect50% 1.6x1.5 smd: 1(-1.1,1.27) 2(-1.1,-1.27) 3(1.1,-1.27) 4(1.1,1.27)
Top Overlay:
  circle w0.2: c-2.55,1.27 r0.1
  lines w0.127: -0.68,-2.54 0.68,-2.54 ; -0.68,2.54 0.68,2.54
Mechanical 13:
  circle w0.2: c-2.55,1.27 r0.1
  lines w0.127: -1.6,-2.54 -1.6,2.54 1.6,2.54 1.6,-2.54 -1.6,-2.54
Mechanical 15:
  lines w0.05: -2,-2.6 -2,2.6 2,2.6 2,-2.6 -2,-2.6
3D body "QFN_5032_4pins.stp": height 0.75, standoff -0.08, extent -1.6,-2.5 1.6,2.5

## SiTime_5032_6 [mm] "5.0 x 3.2 mm 6 Pin"
pads (6):
  rrect50% 1.2x0.9 smd: 1(-1.1,1.27) 2(-1.1,0) 3(-1.1,-1.27) 4(1.1,-1.27) 5(1.1,0) 6(1.1,1.27)
Top Overlay:
  circle w0.2: c-2.55,1.27 r0.1
  lines w0.127: -0.68,-2.54 0.68,-2.54 ; -0.68,2.54 0.68,2.54
Mechanical 13:
  circle w0.2: c-2.55,1.27 r0.1
  lines w0.127: -1.6,-2.54 -1.6,2.54 1.6,2.54 1.6,-2.54 -1.6,-2.54
Mechanical 15:
  lines w0.05: -2,-2.6 -2,2.6 2,2.6 2,-2.6 -2,-2.6
3D body "QFN_5032_6pins.stp": height 0.8, standoff -0.05, extent -1.6,-2.5 1.6,2.5

## TEXAS_DSBGA24 [mm] "YZF"
pads (24):
  round 0.255 smd paste+0 mask+0: A1(-0.75,1.25) A2(-0.25,1.25) A3(0.25,1.25) A4(0.75,1.25) B1(-0.75,0.75) B2(-0.25,0.75) B3(0.25,0.75) B4(0.75,0.75) C1(-0.75,0.25) C2(-0.25,0.25) C3(0.25,0.25) C4(0.75,0.25) D1(-0.75,-0.25) D2(-0.25,-0.25) D3(0.25,-0.25) D4(0.75,-0.25) E1(-0.75,-0.75) E2(-0.25,-0.75) E3(0.25,-0.75) E4(0.75,-0.75) F1(-0.75,-1.25) F2(-0.25,-1.25) F3(0.25,-1.25) F4(0.75,-1.25)
Top Overlay:
  circle w0.25: c-2.05,1.25 r0.125
  lines w0.2: -1.05,-1.55 1.05,-1.55 1.05,1.55 -1.05,1.55 -1.05,-1.55
Mechanical 10:
  lines w0.2: -1.55,-2.05 1.55,-2.05 1.55,2.05 -1.55,2.05 -1.55,-2.05
  text ".Designator" at 0,0.188 h1
Mechanical 12:
  lines w0.2: -1.05,-1.55 1.05,-1.55 1.05,1.55 -1.05,1.55 -1.05,-1.55
Mechanical 15:
  lines w0.1: -0.5,0 0.5,0 ; 0,-0.5 0,0.5
  lines w0.2: -1.55,-2.05 1.55,-2.05 1.55,2.05 -1.55,2.05 -1.55,-2.05
3D body "IC_Texas_Instruments_TPS62180YZFT_eec.STEP": height 0.25, standoff 0, extent -1.55,-2.05 1.55,2.05